# Altium footprint library Connectors.PcbLib: 245 footprints (part 8 of 16)
Each footprint in its own frame and in the unit in brackets; x right, y up, seen from the top. Pads: shape width x height; smd on the part's side, far side on the other; paste and mask are expansions set on the pad; w line width, h text height; cw(c..) or ccw(c..) is an arc to the next point about the centre after c.
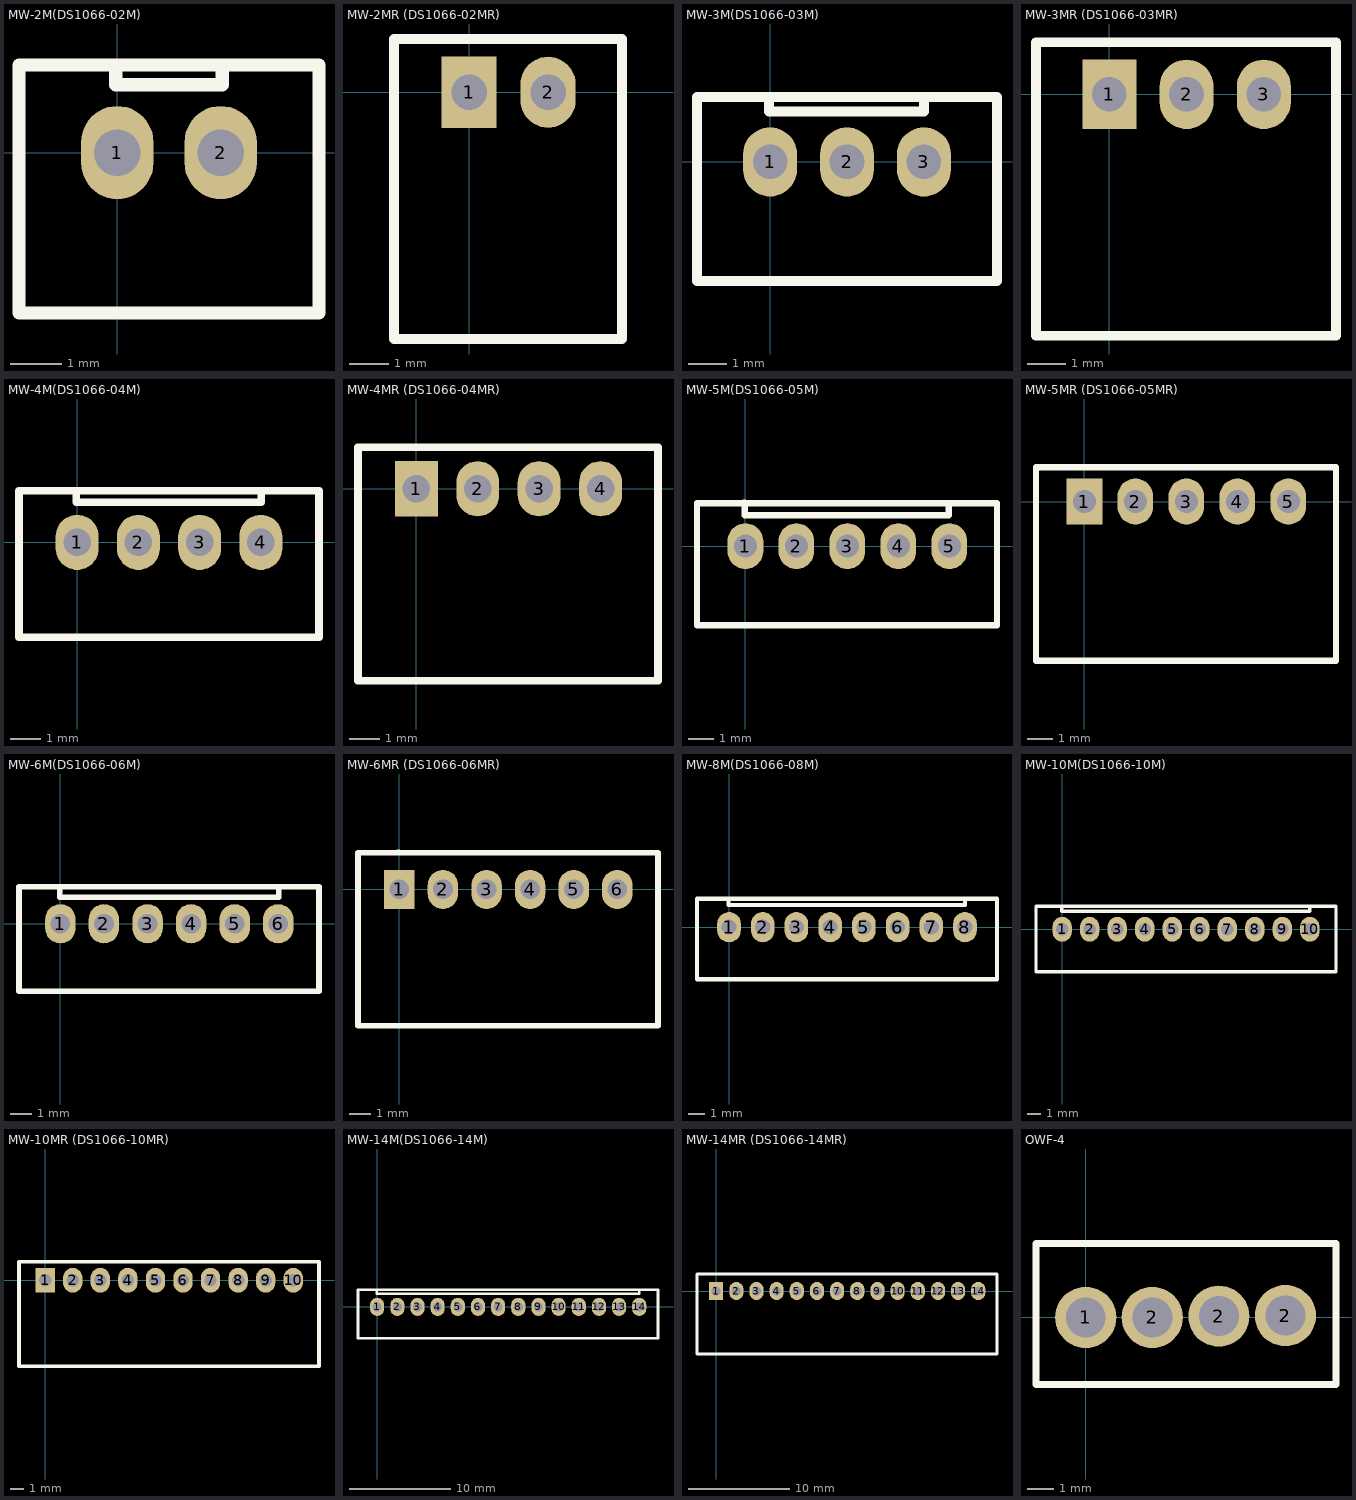
[diagram p7: the footprints below, top view; thin cyan lines are the x and y axes]

## MW-2M(DS1066-02M) [mm]
pads (2):
  oval 1.4x1.8 hole 0.9: 1(0,0) 2(2,0)
Top Overlay:
  lines w0.254: -1.9,-3.1 3.9,-3.1 3.9,1.69 -1.9,1.69 -1.9,-3.09 ; -0.03,1.65 -0.03,1.31 2.03,1.31 2.03,1.65
3D body "User Library-mw-2m-1.step": height 6, standoff -3.2, extent -2.02,-2.67 3.98,1.83

## MW-2MR (DS1066-02MR) [mm]
pads (2):
  rect 1.4x1.8 hole 0.9: 1(0,0)
  oval 1.4x1.8 hole 0.9: 2(2,0)
Top Overlay:
  lines w0.254: -1.9,-6.25 3.87,-6.25 3.87,-3.1 3.87,1.348 -1.9,1.348 -1.9,-3.09 -1.9,-6.25
3D body "User Library-MW-2MR.STEP": height 4.87, standoff -3.33, extent -1.957,-6.151 3.943,1.449

## MW-3M(DS1066-03M) [mm]
pads (3):
  oval 1.4x1.8 hole 0.9: 1(0,0) 2(2,0) 3(4,0)
Top Overlay:
  lines w0.254: -1.9,-3.1 5.9,-3.1 5.9,1.69 -1.9,1.69 -1.9,-3.09 ; -0.03,1.65 -0.03,1.31 4,1.31 4,1.69
3D body: height 2.1, standoff 0, extent -0.15,1.55 4.49,1.82
3D body: height 6.1, standoff 0, extent -1.772,1.545 -0.135,1.815
3D body: height 0.5, standoff 0, extent -2.03,-3.21 5.96,1.82
3D body: height 5.1, standoff -1.5, extent -0.305,-0.275 0.305,0.275
3D body: height 5.1, standoff -1.5, extent 1.695,-0.275 2.305,0.275
3D body: height 5.1, standoff -1.5, extent 3.695,-0.275 4.305,0.275
3D body: height 6.1, standoff 0, extent -2.015,-2.855 -1.735,1.815
3D body: height 6.1, standoff 0, extent -2.015,-3.215 5.9,-2.855
3D body: height 6.1, standoff 0, extent 5.65,-2.85 5.93,1.82
3D body: height 6.1, standoff 0, extent 4.02,1.55 5.65,1.82

## MW-3MR (DS1066-03MR) [mm]
pads (3):
  rect 1.4x1.8 hole 0.9: 1(0,0)
  oval 1.4x1.8 hole 0.9: 2(2,0) 3(4,0)
Top Overlay:
  lines w0.254: -1.9,-6.25 5.87,-6.25 5.87,-3.1 5.87,1.348 -1.9,1.348 -1.9,-3.09 -1.9,-6.25

## MW-4M(DS1066-04M) [mm]
pads (4):
  oval 1.4x1.8 hole 0.9: 1(0,0) 2(2,0) 3(4,0) 4(6,0)
Top Overlay:
  lines w0.254: -1.9,-3.1 7.9,-3.1 7.9,1.69 -1.9,1.69 -1.9,-3.09 ; -0.03,1.65 -0.03,1.31 6.01,1.31 6.01,1.69
3D body "User Library-mw-4m.step": height 6, standoff -3.2, extent -2,-2.65 8,1.85

## MW-4MR (DS1066-04MR) [mm]
pads (4):
  rect 1.4x1.8 hole 0.9: 1(0,-0.001)
  oval 1.4x1.8 hole 0.9: 2(2,-0.001) 3(4,-0.001) 4(6,-0.001)
Top Overlay:
  lines w0.254: -1.9,-6.251 -1.9,-3.091 -1.9,1.347 7.87,1.347 7.87,-3.101 7.87,-6.251 -1.9,-6.251
3D body "MW-4MR_.stp": height 4.8, standoff -3.4, extent -1.965,-6.251 7.935,1.349

## MW-5M(DS1066-05M) [mm]
pads (5):
  oval 1.4x1.8 hole 0.9: 1(0,0) 2(2,0) 3(4,0) 4(6,0) 5(8,0)
Top Overlay:
  lines w0.254: -1.9,-3.1 9.87,-3.1 9.87,1.69 -1.9,1.69 -1.9,-3.09 ; -0.07,1.7 -0.03,1.7 -0.03,1.22 7.97,1.22 7.97,1.69

## MW-5MR (DS1066-05MR) [mm]
pads (5):
  rect 1.4x1.8 hole 0.9: 1(0,0)
  oval 1.4x1.8 hole 0.9: 2(2,0) 3(4,0) 4(6,0) 5(8,0)
Top Overlay:
  lines w0.254: -1.9,-6.25 9.87,-6.25 9.87,-3.1 9.87,1.348 -1.9,1.348 -1.9,-3.09 -1.9,-6.25
3D body "MW-5MR.stp": height 4.8, standoff -3.4, extent -1.965,-6.25 9.935,1.35

## MW-6M(DS1066-06M) [mm]
pads (6):
  oval 1.4x1.8 hole 0.9: 1(0,0) 2(2,0) 3(4,0) 4(6,0) 5(8,0) 6(10,0)
Top Overlay:
  lines w0.254: -1.9,-3.1 11.87,-3.1 11.87,1.69 -1.9,1.69 -1.9,-3.09 ; -0.07,1.7 -0.03,1.7 -0.03,1.22 10.03,1.22 10.03,1.69
3D body "User Library-mw-6m.step": height 6, standoff -3.2, extent -2.02,-2.71 11.98,1.79

## MW-6MR (DS1066-06MR) [mm]
pads (6):
  rect 1.4x1.8 hole 0.9: 1(0,0)
  oval 1.4x1.8 hole 0.9: 2(2,0) 3(4,0) 4(6,0) 5(8,0) 6(10,0)
Top Overlay:
  lines w0.254: -0.07,1.7 -0.03,1.7 ; -1.9,-6.25 -1.9,-3.09 -1.9,1.69 11.87,1.69 11.87,-3.1 11.87,-6.25 -1.9,-6.25
3D body "MW-6MR.stp": height 4.92, standoff -3.28, extent -2.03,-6.25 11.87,1.35

## MW-8M(DS1066-08M) [mm]
pads (8):
  oval 1.4x1.8 hole 0.9: 1(0,0) 2(2,0) 3(4,0) 4(6,0) 5(8,0) 6(10,0) 7(12,0) 8(14,0)
Top Overlay:
  lines w0.254: -1.9,-3.1 15.9,-3.1 15.9,1.69 -1.9,1.69 -1.9,-3.09 ; -0.03,1.65 -0.03,1.31 14,1.31 14,1.69
3D body: height 5.1, standoff -1.5, extent 13.68,-0.27 14.29,0.28
3D body: height 5.1, standoff -1.5, extent 11.68,-0.27 12.29,0.28
3D body: height 5.1, standoff -1.5, extent 9.68,-0.27 10.29,0.28
3D body: height 5.1, standoff -1.5, extent 7.68,-0.27 8.29,0.28
3D body: height 5.1, standoff -1.5, extent 5.68,-0.27 6.29,0.28
3D body: height 5.1, standoff -1.5, extent 3.68,-0.27 4.29,0.28
3D body: height 5.1, standoff -1.5, extent 1.68,-0.27 2.29,0.28
3D body: height 5.1, standoff -1.5, extent -0.32,-0.27 0.29,0.28
3D body: height 6.1, standoff 0, extent 14.02,1.55 15.65,1.82
3D body: height 6.1, standoff 0, extent 15.65,-2.85 15.93,1.82
3D body: height 6.1, standoff 0, extent -2.03,-2.85 -1.75,1.82
3D body: height 0.5, standoff 0, extent -2.03,-3.21 15.89,1.82
3D body: height 6.1, standoff 0, extent -2.015,-3.215 15.88,-2.855
3D body: height 6.1, standoff 0, extent -1.787,1.55 -0.15,1.82
3D body: height 2.1, standoff 0, extent -0.15,1.55 14.69,1.82

## MW-10M(DS1066-10M) [mm]
pads (10):
  oval 1.4x1.8 hole 0.9: 1(0,0) 2(2,0) 3(4,0) 4(6,0) 5(8,0) 6(10,0) 7(12,0) 8(14,0) 9(16,0) 10(18,0)
Top Overlay:
  lines w0.254: -1.9,-3.1 19.9,-3.1 19.9,1.69 -1.9,1.69 -1.9,-3.09 ; -0.03,1.65 -0.03,1.31 18.008,1.31 18.008,1.69
3D body: height 2.1, standoff 0, extent -0.15,1.55 18.008,1.82
3D body: height 6.1, standoff 0, extent -1.787,1.55 -0.15,1.82
3D body: height 6.1, standoff 0, extent -2.015,-3.215 19.874,-2.855
3D body: height 6.1, standoff 0, extent -2.03,-2.85 -1.75,1.82
3D body: height 6.1, standoff 0, extent 19.583,-2.85 19.915,1.82
3D body: height 6.1, standoff 0, extent 18.017,1.55 19.904,1.82
3D body: height 5.1, standoff -1.5, extent -0.32,-0.27 0.29,0.28
3D body: height 5.1, standoff -1.5, extent 1.68,-0.27 2.29,0.28
3D body: height 5.1, standoff -1.5, extent 3.68,-0.27 4.29,0.28
3D body: height 5.1, standoff -1.5, extent 5.68,-0.27 6.29,0.28
3D body: height 5.1, standoff -1.5, extent 7.68,-0.27 8.29,0.28
3D body: height 5.1, standoff -1.5, extent 9.68,-0.27 10.29,0.28
3D body: height 5.1, standoff -1.5, extent 11.68,-0.27 12.29,0.28
3D body: height 5.1, standoff -1.5, extent 13.68,-0.27 14.29,0.28
3D body: height 0.5, standoff 0, extent -2.03,-3.21 19.908,1.82
3D body: height 5.1, standoff -1.5, extent 15.68,-0.27 16.29,0.28
3D body: height 5.1, standoff -1.5, extent 17.68,-0.27 18.29,0.28

## MW-10MR (DS1066-10MR) [mm]
pads (10):
  rect 1.4x1.8 hole 0.9: 1(0,0)
  oval 1.4x1.8 hole 0.9: 2(2,0) 3(4,0) 4(6,0) 5(8,0) 6(10,0) 7(12,0) 8(14,0) 9(16,0) 10(18,0)
Top Overlay:
  lines w0.254: -1.9,-6.25 -1.9,-3.09 -1.9,1.348 19.87,1.348 19.87,-3.1 19.87,-6.25 -1.9,-6.25
3D body "MW-10MR_.stp": height 4.8, standoff -3.4, extent -1.965,-6.25 19.935,1.35

## MW-14M(DS1066-14M) [mm]
pads (14):
  oval 1.4x1.8 hole 0.9: 1(0,0) 2(2,0) 3(4,0) 4(6,0) 5(8,0) 6(10,0) 7(12,0) 8(14,0) 9(16,0) 10(18,0) 11(20,0) 12(22,0) 13(24,0) 14(26,0)
Top Overlay:
  lines w0.254: -1.9,-3.1 27.86,-3.1 27.86,1.69 -1.9,1.69 -1.9,-3.09 ; -0.04,1.67 -0.05,1.67 -0.05,1.29 26.02,1.29 26.02,1.69
3D body: height 5.1, standoff -1.5, extent 25.68,-0.27 26.29,0.28
3D body: height 5.1, standoff -1.5, extent 23.68,-0.27 24.29,0.28
3D body: height 5.1, standoff -1.5, extent 21.68,-0.27 22.29,0.28
3D body: height 5.1, standoff -1.5, extent 19.68,-0.27 20.29,0.28
3D body: height 5.1, standoff -1.5, extent 17.68,-0.27 18.29,0.28
3D body: height 5.1, standoff -1.5, extent 15.68,-0.27 16.29,0.28
3D body: height 5.1, standoff -1.5, extent 13.68,-0.27 14.29,0.28
3D body: height 5.1, standoff -1.5, extent 11.68,-0.27 12.29,0.28
3D body: height 5.1, standoff -1.5, extent 9.68,-0.27 10.29,0.28
3D body: height 5.1, standoff -1.5, extent 7.68,-0.27 8.29,0.28
3D body: height 5.1, standoff -1.5, extent 5.68,-0.27 6.29,0.28
3D body: height 5.1, standoff -1.5, extent 3.68,-0.27 4.29,0.28
3D body: height 5.1, standoff -1.5, extent 1.68,-0.27 2.29,0.28
3D body: height 5.1, standoff -1.5, extent -0.32,-0.27 0.29,0.28
3D body: height 6.1, standoff 0, extent -2.03,-3.21 27.93,-2.85
3D body: height 6.1, standoff 0, extent -2.03,-2.85 -1.75,1.82
3D body: height 6.1, standoff 0, extent 27.65,-2.85 27.93,1.82
3D body: height 6.1, standoff 0, extent -1.787,1.55 -0.15,1.82
3D body: height 6.1, standoff 0, extent 26.02,1.55 27.65,1.82
3D body: height 2.1, standoff 0, extent -0.15,1.55 26.02,1.82
3D body: height 0.5, standoff 0, extent -2.03,-3.21 27.93,1.82

## MW-14MR (DS1066-14MR) [mm]
pads (14):
  rect 1.4x1.8 hole 0.9: 1(0,0)
  oval 1.4x1.8 hole 0.9: 2(2,0) 3(4,0) 4(6,0) 5(8,0) 6(10,0) 7(12,0) 8(14,0) 9(16,0) 10(18,0) 11(20,0) 12(22,0) 13(24,0) 14(26,0)
Top Overlay:
  lines w0.254: -1.9,-6.25 -1.9,-3.09 -1.9,1.69 27.86,1.69 27.86,-3.1 27.86,-6.25 -1.9,-6.25
3D body: height 5.1, standoff -1.5, extent -0.32,-0.27 0.29,0.28
3D body: height 5.1, standoff -1.5, extent 1.68,-0.27 2.29,0.28
3D body: height 5.1, standoff -1.5, extent 3.68,-0.27 4.29,0.28
3D body: height 5.1, standoff -1.5, extent 5.68,-0.27 6.29,0.28
3D body: height 5.1, standoff -1.5, extent 7.68,-0.27 8.29,0.28
3D body: height 5.1, standoff -1.5, extent 9.68,-0.27 10.29,0.28
3D body: height 5.1, standoff -1.5, extent 11.68,-0.27 12.29,0.28
3D body: height 5.1, standoff -1.5, extent 13.68,-0.27 14.29,0.28
3D body: height 5.1, standoff -1.5, extent 15.68,-0.27 16.29,0.28
3D body: height 5.1, standoff -1.5, extent 17.68,-0.27 18.29,0.28
3D body: height 5.1, standoff -1.5, extent 19.68,-0.27 20.29,0.28
3D body: height 5.1, standoff -1.5, extent 21.68,-0.27 22.29,0.28
3D body: height 5.1, standoff -1.5, extent 23.68,-0.27 24.29,0.28
3D body: height 5.1, standoff -1.5, extent 25.68,-0.27 26.29,0.28

## OWF-4 [mm]
pads (4):
  round 2.3 hole 1.5: 1(0,0) 2(2.5,0) 2(5,0.05) 2(7.5,0.07)
Top Overlay:
  lines w0.254: -1.87,-2.52 -1.87,2.78 9.4,2.78 9.4,1.089 9.4,-2.52 -1.87,-2.52
3D body "User Library-CWF-4.STEP": height 7, standoff -3.5, extent -2.5,-3.225 9.9,2.525